# Altium footprint library balancing.PcbLib: 7 footprints
Each footprint in its own frame and in the unit in brackets; x right, y up, seen from the top. Pads: shape width x height; smd on the part's side, far side on the other; paste and mask are expansions set on the pad; w line width, h text height; cw(c..) or ccw(c..) is an arc to the next point about the centre after c.
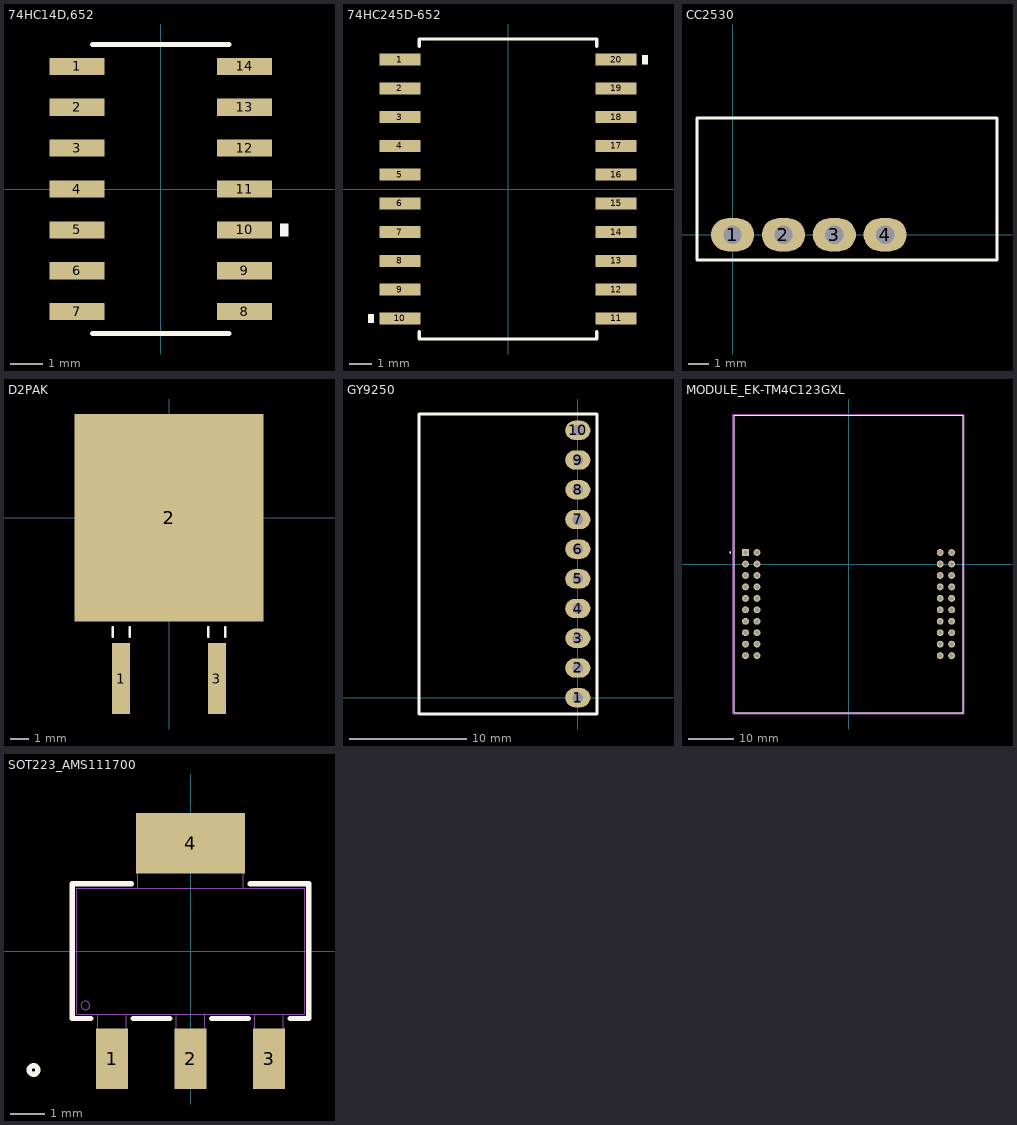
[diagram p0: the footprints below, top view; thin cyan lines are the x and y axes]

## 74HC14D,652 [mil]
pads (14):
  rect 67x21 smd paste+0 mask+0: 1(-102.5,150) 2(-102.5,100) 3(-102.5,50) 4(-102.5,0) 5(-102.5,-50) 6(-102.5,-100) 7(-102.5,-150) 8(102.5,-150) 9(102.5,-100) 10(102.5,-50) 11(102.5,0) 12(102.5,50) 13(102.5,100) 14(102.5,150)
Top Overlay:
  region: 146,-42.5 156,-42.5 156,-57.5 146,-57.5
  lines w6: -83.5,-177 83.5,-177 ; -83.5,177 83.5,177
3D body "SOT108-1_NEX.step": height 69.09, standoff 0, extent -122,-172 122.01,172.01
3D body: height 10, standoff 0, extent 0,0 10,10

## 74HC245D-652 [mil]
pads (20):
  rect 71x21 smd paste+0 mask+0: 1(-188,225) 2(-188,175) 3(-188,125) 4(-188,75) 5(-188,25) 6(-188,-25) 7(-188,-75) 8(-188,-125) 9(-188,-175) 10(-188,-225) 11(188,-225) 12(188,-175) 13(188,-125) 14(188,-75) 15(188,-25) 16(188,25) 17(188,75) 18(188,125) 19(188,175) 20(188,225)
Top Overlay:
  region: -233.5,-217.5 -243.5,-217.5 -243.5,-232.5 -233.5,-232.5
  region: 233.5,232.5 243.5,232.5 243.5,217.5 233.5,217.5
  lines w6: -154.5,-248.6 -154.5,-261 154.5,-261 154.5,-248.6 ; -154.5,248.6 -154.5,261 154.5,261 154.5,248.6
3D body: height 10, standoff 0, extent 0,0 10,10
3D body "SOT163-1_NEX.step": height 104.09, standoff 0, extent -209.48,-255.98 209.5,255.99

## CC2530 [mil]
pads (4):
  oval 85x65 hole 36: 1(0,0) 2(100,0) 3(200,0) 4(300,0)
Top Overlay:
  lines w6: -70,-50 520,-50 520,230 -70,230 -70,-50
3D body "HC-06.SLDPRT": height 1548.03, standoff -135.04, extent -145.28,-20 445.28,220.16

## D2PAK [mil]
pads (3):
  rect 39x154 smd: 1(-103.94,-349.5) 3(103.94,-349.5)
  rect 411x451 smd: 2(0,0)
Top Overlay:
  lines w6: -122.44,-258.5 -122.44,-238.6 ; -85.44,-258.5 -85.44,-238.6 ; 85.44,-258.5 85.44,-238.6 ; 122.44,-258.5 122.44,-238.6
3D body: height 10, standoff 0, extent 0,0 10,10
3D body "D2PAK.step": height 181.1, standoff -2.01, extent -204.48,-359.01 204.49,171.62

## GY9250 [mil]
pads (10):
  oval 85x65 hole 36: 1(0,0) 2(0,100) 3(0,200) 4(0,300) 5(0,400) 6(0,500) 7(0,600) 8(0,700) 9(0,800) 10(0,900)
Top Overlay:
  lines w10: -535,-55 65,-55 65,955 -535,955 -535,-55
3D body "MPU-9250.stp": height 416.97, standoff -85.99, extent -530.27,-50 60.28,950

## MODULE_EK-TM4C123GXL [mm]
pads (40):
  rect 1.52x1.52 hole 0.89: J1_1(-22.86,2.54)
  round 1.52 hole 0.89: J1_2(-22.86,0) J1_3(-22.86,-2.54) J1_4(-22.86,-5.08) J1_5(-22.86,-7.62) J1_6(-22.86,-10.16) J1_7(-22.86,-12.7) J1_8(-22.86,-15.24) J1_9(-22.86,-17.78) J1_10(-22.86,-20.32) J2_1(22.86,2.54) J2_2(22.86,0) J2_3(22.86,-2.54) J2_4(22.86,-5.08) J2_5(22.86,-7.62) J2_6(22.86,-10.16) J2_7(22.86,-12.7) J2_8(22.86,-15.24) J2_9(22.86,-17.78) J2_10(22.86,-20.32) J3_1(-20.32,2.54) J3_2(-20.32,0) J3_3(-20.32,-2.54) J3_4(-20.32,-5.08) J3_5(-20.32,-7.62) J3_6(-20.32,-10.16) J3_7(-20.32,-12.7) J3_8(-20.32,-15.24) J3_9(-20.32,-17.78) J3_10(-20.32,-20.32) J4_1(20.32,2.54) J4_2(20.32,0) J4_3(20.32,-2.54) J4_4(20.32,-5.08) J4_5(20.32,-7.62) J4_6(20.32,-10.16) J4_7(20.32,-12.7) J4_8(20.32,-15.24) J4_9(20.32,-17.78) J4_10(20.32,-20.32)
Top Overlay:
  circle w0.2: c-26.25,2.54 r0.1
  lines w0.127: -25.4,-33.02 25.4,-33.02 25.4,33.02 -25.4,33.02 -25.4,-33.02
Mechanical 13:
  circle w0.2: c-26.25,2.54 r0.1
  lines w0.127: -25.4,-33.02 25.4,-33.02 25.4,33.02 -25.4,33.02 -25.4,-33.02
Mechanical 15:
  lines w0.05: -25.65,-33.27 -25.65,33.27 25.65,33.27 25.65,-33.27 -25.65,-33.27
3D body "TM4c.SLDPRT": height 22.2, standoff 4.7, extent -25.654,-32.512 25.146,33.528

## SOT223_AMS111700 [mil]
pads (4):
  rect 37x70 smd paste+0 mask+0: 1(-91,-124.8) 2(0,-124.8) 3(91,-124.8)
  rect 126x70 smd paste+0 mask+0: 4(0,124.8)
Top Overlay:
  circle w6: c-182,-137.8 r5
  lines w6: -115.2,-78 -137,-78 -137,78 -68.7,78 ; -66.8,-78 -24.2,-78 ; 24.2,-78 66.8,-78 ; 68.7,78 137,78 137,-78 115.2,-78
Mechanical 13:
  circle w0: c-122,-63 r5
  lines w1: -132,-73 -132,73 132,73 132,-73 -132,-73 ; -107.5,-137.8 -74.5,-137.8 -74.5,-73 -107.5,-73 -107.5,-137.8 ; -61,73 -61,137.8 61,137.8 61,73 -61,73 ; -16.5,-137.8 16.5,-137.8 16.5,-73 -16.5,-73 -16.5,-137.8 ; 74.5,-137.8 107.5,-137.8 107.5,-73 74.5,-73 74.5,-137.8
3D body: height 10, standoff 0, extent 0,0 10,10
3D body "SOT223_AMS1117-5_0_ADS.step": height 71.1, standoff 0, extent -132,-137.79 132.02,137.8